# Altium footprint library GyokuRe.PcbLib: 1248 footprints (part 61 of 78)
Each footprint in its own frame and in the unit in brackets; x right, y up, seen from the top. Pads: shape width x height; smd on the part's side, far side on the other; paste and mask are expansions set on the pad; w line width, h text height; cw(c..) or ccw(c..) is an arc to the next point about the centre after c.
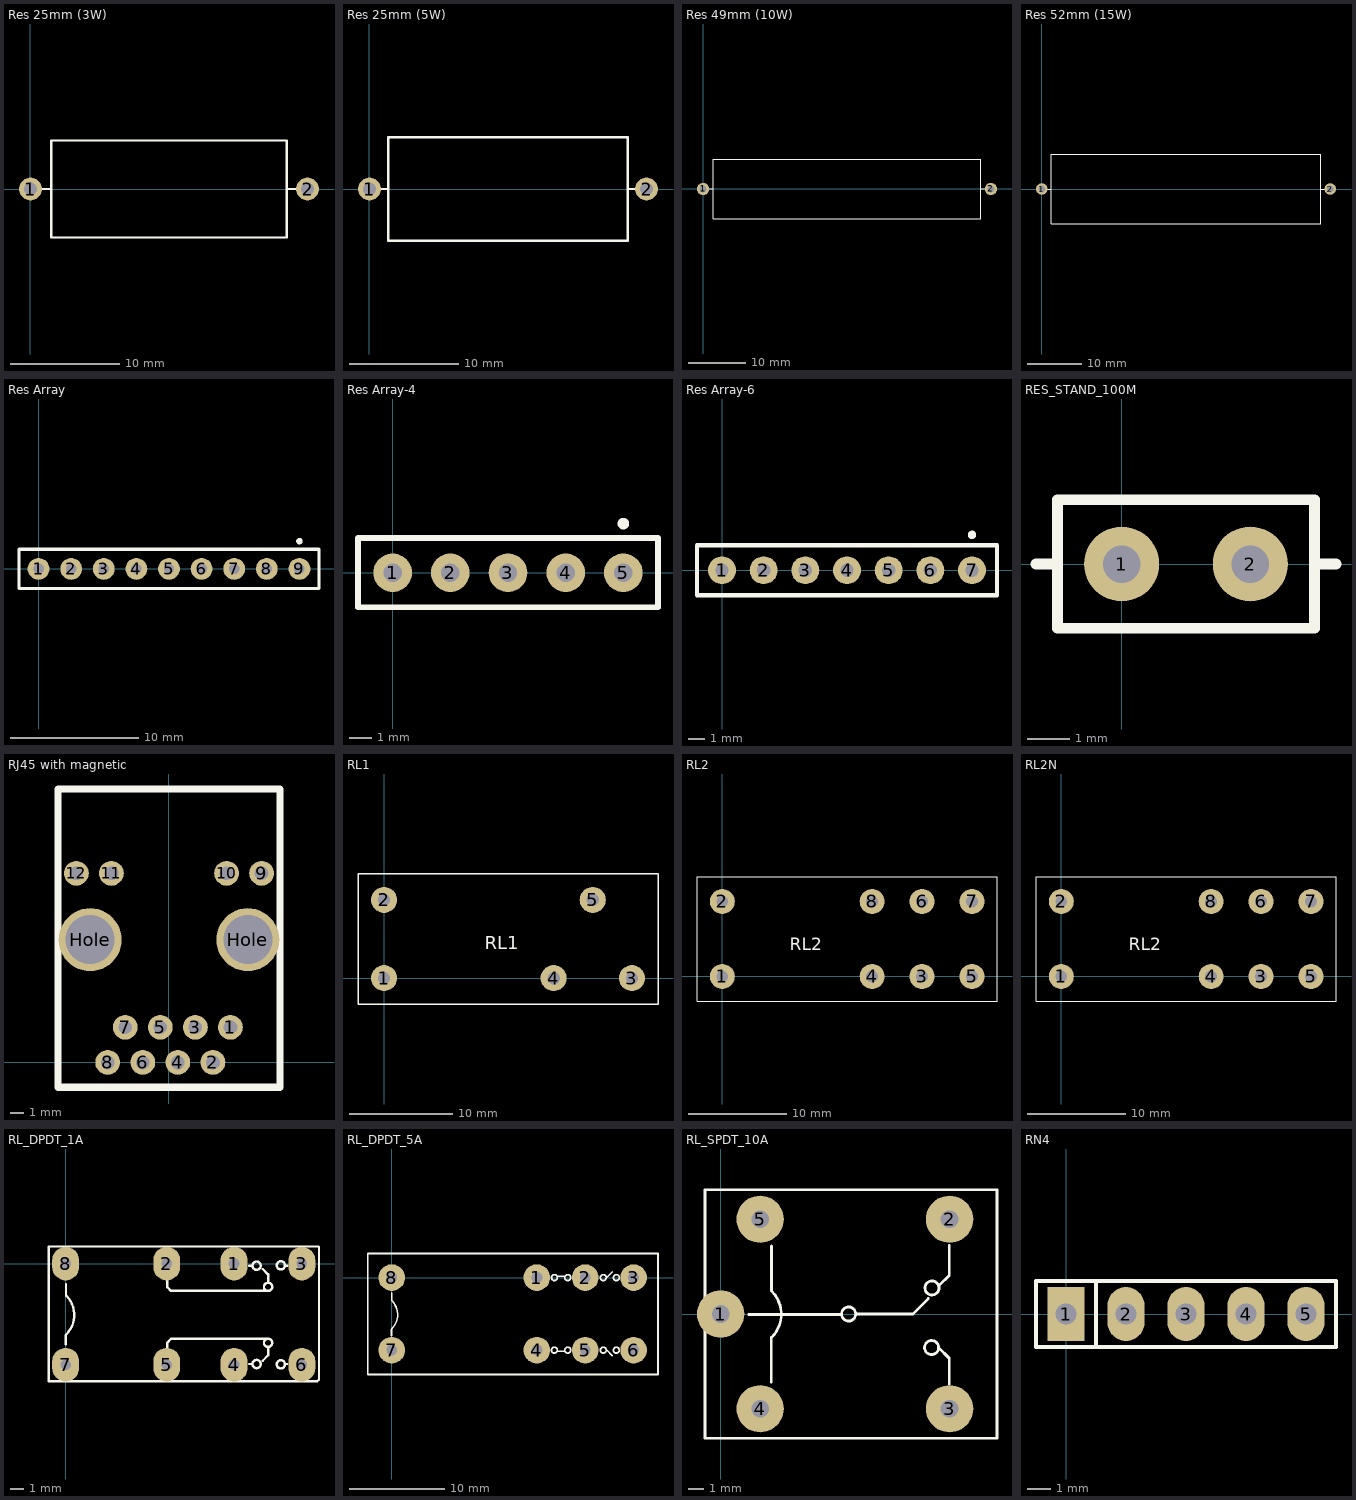
[diagram p60: the footprints below, top view; thin cyan lines are the x and y axes]

## Res 25mm (3W) [mil] "Resistor; 2 Leads; 3W; Solder Pad 35mil"
height 80
pads (2):
  round 83 hole 48: 1(0,0) 2(1000,0)
Top Overlay:
  lines w7.87: 0,0 75,0 ; 925,0 1000,0 ; 75,-175 75,175 925,175 925,-175 75,-175
3D body "Resistor 3W.STEP": height 351.85, standoff -98.74, extent -19.68,-174.81 1019.69,175.18

## Res 25mm (5W) [mil] "Resistor; 2 Leads; 5W; Solder Pad 35mil"
height 80
pads (2):
  round 83 hole 48: 1(0,0) 2(1000,0)
Top Overlay:
  lines w7.87: 0,0 68,0 ; 932,0 1000,0 ; 68,-187 932,-187 932,187 68,187 68,-187
3D body "5W Resistor.STEP": height 363.6, standoff -97.43, extent -19.69,-190.89 1019.68,191

## Res 49mm (10W) [mil] "Resistor; 2 Leads; 10W; Solder Pad 35mil"
height 80
pads (2):
  round 83 hole 48: 1(0,0) 2(1960,0)
Top Overlay:
  lines w7.87: 0,0 69,0 ; 1891,0 1960,0 ; 69,-201 69,201 1891,201 1891,-201 69,-201
3D body "10W Resistor.STEP": height 363.6, standoff -97.43, extent -19.68,-204.99 1979.69,205

## Res 52mm (15W) [mil] "Resistor; 2 Leads; 15W; Solder Pad 35mil"
height 80
pads (2):
  round 83 hole 48: 1(0,0) 2(2080,0)
Top Overlay:
  lines w7.87: 0,0 70,0 ; 2011,0 2080,0 ; 70,-250 2011,-250 2011,250 70,250 70,-250
3D body "Resistor 15W.STEP": height 363.6, standoff -97.43, extent -19.68,-253.42 2099.7,253.58

## Res Array [mil] "Resistor Array; 9 Leads; Solder Pad 35mil"
pads (9):
  round 67 hole 32: 1(0,0) 2(100,0) 3(200,0) 4(300,0) 5(400,0) 6(500,0) 7(600,0) 8(700,0) 9(800,0)
Top Overlay:
  circle w10: c800,85 r5
  lines w10: -60,-60 860,-60 860,60 -60,60 -60,-60
3D body "SW3dPS-80015102.STEP": height 199.29, standoff -135.35, extent -42.5,-24.21 843.33,25

## Res Array-4 [mil] "Resistor Array; 4 Leads; Solder Pad 35mil"
pads (5):
  round 67 hole 32: 1(0,0) 2(100,0) 3(200,0) 4(300,0) 5(400,0)
Top Overlay:
  circle w10: c400,85 r5
  lines w10: -60,-60 460,-60 460,60 -60,60 -60,-60

## Res Array-6 [mil] "Resistor Array; 6 Leads; Solder Pad 35mil"
pads (7):
  round 67 hole 32: 1(0,0) 2(100,0) 3(200,0) 4(300,0) 5(400,0) 6(500,0) 7(600,0)
Top Overlay:
  circle w10: c600,85 r5
  lines w10: -60,-60 660,-60 660,60 -60,60 -60,-60

## RES_STAND_100M [mil]
pads (2):
  round 70 hole 35: 1(0,0) 2(120,0)
Top Overlay:
  lines w10: -80,0 -60,0 ; 180,0 200,0 ; -60,-60 -60,60 180,60 180,-60 -60,-60
3D body "User Library-Resistor-Up.STEP": height 348, standoff -65, extent -10,-46 166,46

## RJ45 with magnetic [mm]
pads (14):
  round 1.8 hole 1: 1(4.45,2.54) 2(3.18,0) 3(1.91,2.54) 4(0.64,0) 5(-0.63,2.54) 6(-1.9,0) 7(-3.17,2.54) 8(-4.44,0) 9(6.715,13.7) 10(4.175,13.7) 11(-4.175,13.7) 12(-6.715,13.7)
  round 4.572 hole 3.556: Hole(-5.715,8.89) Hole(5.715,8.89)
Top Overlay:
  lines w0.508: -8.05,-1.803 -8.05,19.812 8.05,19.812 8.05,0 8.05,-1.803 -8.05,-1.803
Bottom Overlay:
  lines w0.1: -7.95,-1.93 8.052,-1.93 8.052,19.761 -7.95,19.761 -7.95,-1.93
3D body "RJ45.STEP": height 14.75, standoff -3.68, extent -8.355,-1.035 8.355,15.215

## RL1 [mm] "Relè body 29x12mm - 1 way - FEME"
pads (5):
  round 2.54 hole 1.2 unplated: 1(0,0) 2(0,7.62) 3(24.13,0) 4(16.51,0) 5(20.32,7.62)
Top Overlay:
  lines w0.127: -2.54,-2.54 -2.54,10.16 26.67,10.16 26.67,-2.54 -2.54,-2.54
  text "RL1" at 9.779,2.794 h1.27

## RL2 [mm] "Relè body 29x12mm - 2 way - FEME"
pads (8):
  round 2.54 hole 1.2: 1(0,0) 2(0,7.62) 3(20.32,0) 4(15.24,0) 5(25.4,0) 6(20.32,7.62) 7(25.4,7.62) 8(15.24,7.62)
Top Overlay:
  lines w0.127: -2.54,-2.54 27.94,-2.54 27.94,10.16 -2.54,10.16 -2.54,-2.54
  text "RL2" at 6.858,2.667 h1.27
Bottom Overlay:
  lines w0.254: -2.575,-2.55 -2.575,10.125 27.925,10.125 27.925,-2.55 -2.575,-2.55
3D body: height 22, standoff 0.1, extent -2.45,-2.45 27.9,10.1

## RL2N [mm] "Relè body 29x12mm - 2 way - FEME"
pads (8):
  round 2.54 hole 1.2: 1(0,0) 2(0,7.62) 3(20.32,0) 4(15.24,0) 5(25.4,0) 6(20.32,7.62) 7(25.4,7.62) 8(15.24,7.62)
Top Overlay:
  lines w0.127: -2.54,-2.54 -2.54,10.16 27.94,10.16 27.94,-2.54 -2.54,-2.54
  text "RL2" at 6.858,2.667 h1.27
Bottom Overlay:
  lines w0.254: -2.575,-2.55 27.925,-2.55 27.925,10.125 -2.575,10.125 -2.575,-2.55
3D body "Relay.STEP": height 20.9, standoff -3.99, extent -1.941,-2.465 27.559,10.035

## RL_DPDT_1A [mil] "Reley DPDT, 8 pin, 1A, W400mil, L800mil,H 300mil"
height 300
pads (8):
  oval 80x100 hole 32: 1(500,0) 2(300,0) 3(701,0) 4(500,-300) 5(300,-300) 6(701,-300) 7(0,-300) 8(0,0)
Top Overlay:
  circle w7: c638.76,-5 r12.24
  circle w7: c566.76,-6 r12.24
  circle w7: c600.76,-69 r12.24
  circle w7: c600.76,-235 r12.24
  circle w7: c566.76,-298 r12.24
  circle w7: c638.76,-299 r12.24
  lines w7: 0,-239 0,-212 ; 1,-211 ccw(c-56.5,-152.5) 2,-95 ; 1,-94 1,-61 ; 302,-255 302,-234 313,-223 599,-223 ; 302,-42 302,-70 313,-81 599,-81 ; 544,-298 552,-298 ; 544,-6 552,-6 ; 585,-288 601,-272 601,-249 ; 585,-16 601,-32 601,-55 ; 653,-298 658,-298 ; 653,-6 658,-6 ; -50,-349 747,-349 752,-344 752,49 750,51 -50,51 -50,-349
3D body "SW3dPS-DSY2Y.STEP": height 484.25, standoff -118.11, extent -59.45,-340 759.45,45.83

## RL_DPDT_5A [mil] "Reley DPDT, 8 pin, 5A, W500mil, L1100mil,H 950mil"
height 300
pads (8):
  round 110 hole 45: 1(600,0) 2(800,0) 3(1000,0) 4(600,-300) 5(800,-300) 6(1000,-300) 7(0,-300) 8(0,0)
Top Overlay:
  circle w7: c928.76,0 r12.24
  circle w7: c874.76,0 r12.24
  circle w7: c727.76,0 r12.24
  circle w7: c672.76,0 r12.24
  circle w7: c672.76,-300 r12.24
  circle w7: c727.76,-300 r12.24
  circle w7: c874.76,-300 r12.24
  circle w7: c928.76,-300 r12.24
  lines w7: -1,-240 -1,-213 ; 0,-212 ccw(c-57.5,-153.5) 1,-96 ; 0,-95 0,-62 ; 687,-305 716,-305 ; 687,5 716,5 ; 888,-299 912,-323 ; 888,-1 912,23 ; -99,-401 -99,100 1101,100 1101,-401 -99,-401

## RL_SPDT_10A [mil] "Relay SPDT, 5 pin, 10A,W 650mil, L 800mil, H 800mil"
height 800
pads (5):
  round 120 hole 45: 1(0,0) 2(580,240) 3(580,-240) 4(100,-240) 5(100,240)
Top Overlay:
  circle w7: c324.2,0 r17.8
  circle w7: c535.2,66 r17.8
  circle w7: c534.2,-85 r17.8
  lines w7: 71,-1 304,-1 ; 128,-173 128,-60 ; 129,-59 ccw(c71.5,-0.5) 130,57 ; 129,58 129,172 ; 344,0 487,0 526,39 ; 552,-85 579,-112 579,-178 ; 553,72 579,98 579,174 ; -40,-315 700,-315 700,315 -40,315 -40,-315

## RN4 [mil] "R SIP4, 5 Pin"
height 200
pads (5):
  rect 62x90 hole 35: 1(0,0)
  oval 62x90 hole 35: 2(100,0) 3(200,0) 4(300,0) 5(400,0)
Top Overlay:
  lines w7: 50,-55 50,55 ; -50,-55 450,-55 450,55 -50,55 -50,-55